# Altium schematic symbol library Regulator_Switching.SchLib: 1070 symbols (part 3 of 9)
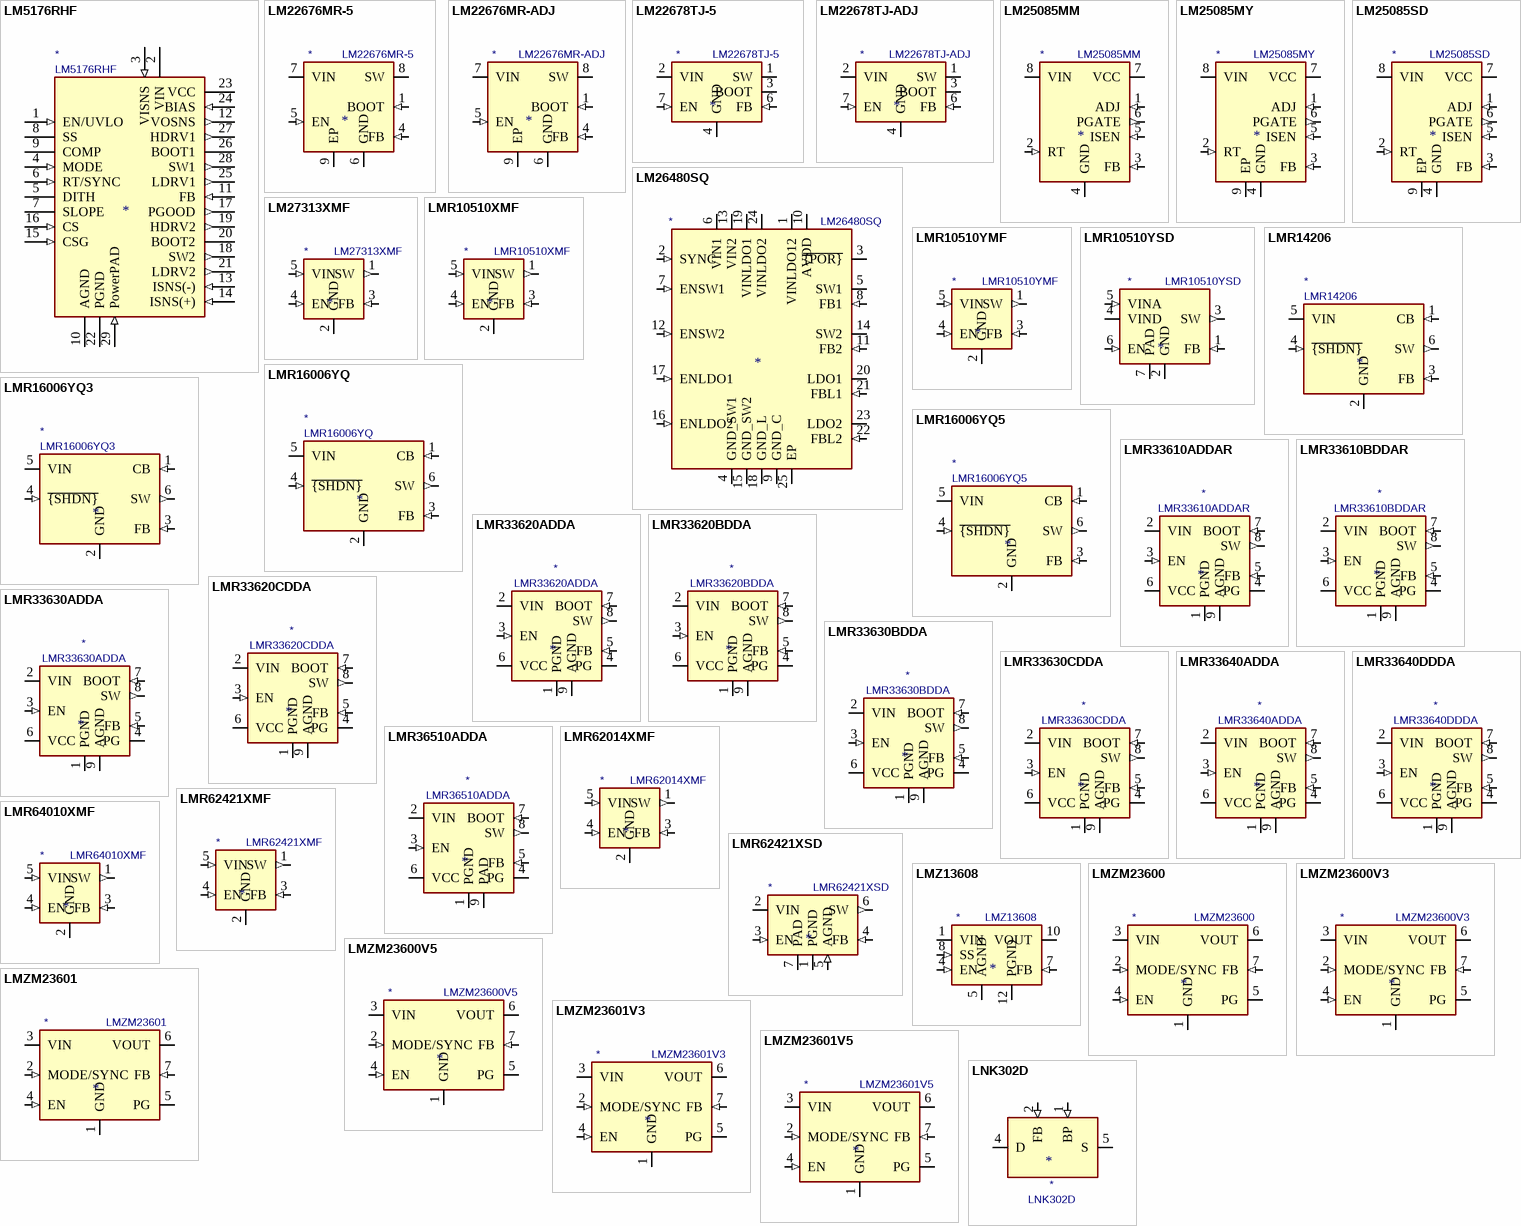
[diagram p28: symbols LM5176RHF to LNK302D]

## LM22676MR-ADJ
designator *  value LM22676MR-ADJ
ki_keywords: DC/DC Buck Converter 3A; ki_description: 3A Step-Down Switching Voltage Regulater, 4.5-42V Input, Adjustable Output, 500kHz Switching Frequency, SOIC-8; ki_fp_filters: TI*SO*PowerPAD*; Footprint: Package_SO:TI_SO-PowerPAD-8; Supplier: http://www.ti.com/lit/ds/symlink/lm22676.pdf
footprint TI_SO-PowerPAD-8
pins: 1 BOOT (in), 2 NC (in) hidden, 3 NC (in) hidden, 4 FB (in), 5 EN (in), 6 GND (power), 7 VIN (power), 8 SW (power), 9 EP (power)

## LM22678TJ-5
designator *  value LM22678TJ-5
ki_keywords: DC/DC Buck Converter 5A; ki_description: 5A Step-Down Switching Voltage Regulater, 4.5-42V Input, 5V Output, 500kHz Switching Frequency, TO-263; ki_fp_filters: TO?263*; Footprint: Package_TO_SOT_SMD:TO-263-7_TabPin8; Supplier: https://www.ti.com/lit/ds/symlink/lm22678.pdf
footprint TO-263-7_TabPin8
pins: 1 SW (power), 2 VIN (power), 3 BOOT, 4 GND (power), 5 NC (in) hidden, 6 FB (in), 7 EN (in), 8 GND hidden

## LM22678TJ-ADJ
designator *  value LM22678TJ-ADJ
ki_keywords: DC/DC Buck Converter 5A; ki_description: 5A Step-Down Switching Voltage Regulater, 4.5-42V Input, Adjustable Output, 500kHz Switching Frequency, TO-263; ki_fp_filters: TO?263*; Footprint: Package_TO_SOT_SMD:TO-263-7_TabPin8; Supplier: https://www.ti.com/lit/ds/symlink/lm22678.pdf
footprint TO-263-7_TabPin8
pins: 1 SW (power), 2 VIN (power), 3 BOOT, 4 GND (power), 5 NC (in) hidden, 6 FB (in), 7 EN (in), 8 GND hidden

## LM25085MM
designator *  value LM25085MM
ki_keywords: buck switching controller; ki_description: 42V Constant On-Time PFET Buck Switching Controller, MSOP-8; ki_fp_filters: MSOP*3x3mm*P0.65mm*; Footprint: Package_SO:MSOP-8_3x3mm_P0.65mm; Supplier: http://www.ti.com/lit/ds/symlink/lm25085.pdf
footprint MSOP-8_3x3mm_P0.65mm
pins: 1 ADJ (in), 2 RT (in), 3 FB (in), 4 GND (power), 5 ISEN (in), 6 PGATE (out), 7 VCC (power), 8 VIN (power)

## LM25085MY
designator *  value LM25085MY
ki_keywords: buck switching controller; ki_description: 42V Constant On-Time PFET Buck Switching Controller, MSOP-8-EP; ki_fp_filters: MSOP*1EP*3x3mm*P0.65mm*; Footprint: Package_SO:MSOP-8-1EP_3x3mm_P0.65mm_EP1.73x1.85mm_ThermalVias; Supplier: http://www.ti.com/lit/ds/symlink/lm25085.pdf
footprint MSOP-8-1EP_3x3mm_P0.65mm_EP1.73x1.85mm_ThermalVias
pins: 1 ADJ (in), 2 RT (in), 3 FB (in), 4 GND (power), 5 ISEN (in), 6 PGATE (out), 7 VCC (power), 8 VIN (power), 9 EP

## LM25085SD
designator *  value LM25085SD
ki_keywords: buck switching controller; ki_description: 42V Constant On-Time PFET Buck Switching Controller, WSON-8; ki_fp_filters: WSON*1EP*3x3mm*P0.5mm*EP1.6x2.0mm*; Footprint: Package_SON:WSON-8-1EP_3x3mm_P0.5mm_EP1.6x2.0mm; Supplier: http://www.ti.com/lit/ds/symlink/lm25085.pdf
footprint WSON-8-1EP_3x3mm_P0.5mm_EP1.6x2.0mm
pins: 1 ADJ (in), 2 RT (in), 3 FB (in), 4 GND (power), 5 ISEN (in), 6 PGATE (out), 7 VCC (power), 8 VIN (power), 9 EP

## LM26480SQ
designator *  value LM26480SQ
ki_keywords: Dual Buck Regulator LDO 2MHz 1.5A 300mA; ki_description: Dual 1.5A 2MHz Buck Regulators and Dual 300mA LDOs, WQFN-24; ki_fp_filters: WQFN*1EP*4x4mm*P0.5mm*; Footprint: Package_DFN_QFN:WQFN-24-1EP_4x4mm_P0.5mm_EP2.6x2.6mm; Supplier: http://www.ti.com/lit/ds/symlink/lm26480.pdf
footprint WQFN-24-1EP_4x4mm_P0.5mm_EP2.6x2.6mm
pins: 1 VINLDO12 (power), 2 SYNC (in), 3 ~{{POR}} (oc), 4 GND_SW1 (power), 5 SW1 (power), 6 VIN1 (power), 7 ENSW1 (in), 8 FB1 (in), 9 GND_C (power), 10 AVDD (power), 11 FB2 (in), 12 ENSW2 (in), 13 VIN2 (power), 14 SW2 (power), 15 GND_SW2 (power), 16 ENLDO2 (in), 17 ENLDO1 (in), 18 GND_L (power), 19 VINLDO1 (power), 20 LDO1 (power), 21 FBL1 (in), 22 FBL2 (in), 23 LDO2 (power), 24 VINLDO2 (power), 25 EP

## LM27313XMF
designator *  value LM27313XMF
ki_keywords: Miniature Step-Up Boost Voltage Regulator; ki_description: 1A, 28Vout Boost Voltage Regulator, 1.6MHz Frequency, SOT-23-5; ki_fp_filters: SOT?23*; Footprint: Package_TO_SOT_SMD:SOT-23-5; Supplier: http://www.ti.com/lit/ds/symlink/lm27313.pdf
footprint SOT-23-5
pins: 1 SW (out), 2 GND (power), 3 FB (in), 4 EN (in), 5 VIN (in)

## LMR10510XMF
designator *  value LMR10510XMF
ki_keywords: Miniature Step-Down Buck Voltage Regulator; ki_description: 1A, 5.5V Step-Down Voltage Regulator, 1.6MHz Frequency, SOT-23-5; ki_fp_filters: SOT?23*; Footprint: Package_TO_SOT_SMD:SOT-23-5; Supplier: http://www.ti.com/lit/ds/symlink/lmr10510.pdf
footprint SOT-23-5
pins: 1 SW (out), 2 GND (power), 3 FB (in), 4 EN (in), 5 VIN (in)

## LMR10510YMF
designator *  value LMR10510YMF
ki_keywords: Miniature Step-Down Buck Voltage Regulator; ki_description: 1A, 5.5V Step-Down Voltage Regulator, 3MHz Frequency, SOT-23-5; ki_fp_filters: SOT?23*; Footprint: Package_TO_SOT_SMD:SOT-23-5; Supplier: http://www.ti.com/lit/ds/symlink/lmr10510.pdf
footprint SOT-23-5
pins: 1 SW (out), 2 GND (power), 3 FB (in), 4 EN (in), 5 VIN (in)

## LMR10510YSD
designator *  value LMR10510YSD
ki_keywords: Miniature Step-Down Buck Voltage Regulator; ki_description: 1A, 5.5V Step-Down Voltage Regulator, 3MHz Frequency, WSON-6; ki_fp_filters: WSON*EP*3x3mm*P0.95mm*; Footprint: Package_SON:WSON-6-1EP_3x3mm_P0.95mm; Supplier: http://www.ti.com/lit/ds/symlink/lmr10510.pdf
footprint WSON-6-1EP_3x3mm_P0.95mm
pins: 1 FB (in), 2 GND (power), 3 SW (out), 4 VIND (power), 5 VINA (in), 6 EN (in), 7 PAD

## LMR14206
designator *  value LMR14206
ki_keywords: simple-switcher buck step-down voltage-regulator; ki_description: Simple Switcher Buck Regulator, Vin=4.5-42V, Iout=600mA, Adjustable output voltage, SOT-23-6 package; ki_fp_filters: SOT?23*; Footprint: Package_TO_SOT_SMD:SOT-23-6; Supplier: http://www.ti.com/lit/ds/symlink/lmr14206.pdf
footprint SOT-23-6
pins: 1 CB (in), 2 GND (power), 3 FB (in), 4 ~{{SHDN}} (in), 5 VIN (power), 6 SW (out)

## LMR16006YQ
designator *  value LMR16006YQ
ki_keywords: simple-switcher buck step-down voltage-regulator; ki_description: Simple Switcher Buck Regulator, Vin=4-40V, Iout=600mA, Adjustable output voltage, SOT-23-6 package; ki_fp_filters: SOT?23*; Footprint: Package_TO_SOT_SMD:SOT-23-6; Supplier: http://www.ti.com/lit/ds/symlink/lmr16006y-q1.pdf
footprint SOT-23-6
pins: 1 CB (in), 2 GND (power), 3 FB (in), 4 ~{{SHDN}} (in), 5 VIN (power), 6 SW (out)

## LMR16006YQ3
designator *  value LMR16006YQ3
ki_keywords: simple-switcher buck step-down voltage-regulator; ki_description: Simple Switcher Buck Regulator, Vin=4-40V, Iout=600mA, Fixed 3.3V output voltage, SOT-23-6 package; ki_fp_filters: SOT?23*; Footprint: Package_TO_SOT_SMD:SOT-23-6; Supplier: http://www.ti.com/lit/ds/symlink/lmr16006y-q1.pdf
footprint SOT-23-6
pins: 1 CB (in), 2 GND (power), 3 FB (in), 4 ~{{SHDN}} (in), 5 VIN (power), 6 SW (out)

## LMR16006YQ5
designator *  value LMR16006YQ5
ki_keywords: simple-switcher buck step-down voltage-regulator; ki_description: Simple Switcher Buck Regulator, Vin=4-40V, Iout=600mA, Fixed 5.0V output voltage, SOT-23-6 package; ki_fp_filters: SOT?23*; Footprint: Package_TO_SOT_SMD:SOT-23-6; Supplier: http://www.ti.com/lit/ds/symlink/lmr16006y-q1.pdf
footprint SOT-23-6
pins: 1 CB (in), 2 GND (power), 3 FB (in), 4 ~{{SHDN}} (in), 5 VIN (power), 6 SW (out)

## LMR33610ADDAR
designator *  value LMR33610ADDAR
ki_keywords: simple-switcher synchronous buck step-down voltage-regulator; ki_description: Simple Switcher Synchronous Buck Regulator, Vin=3.8-36V, Iout=1A, F=400kHz, Adjustable output voltage, HSOP-8; ki_fp_filters: Texas*HSOP*1EP*; Footprint: Package_SO:Texas_HSOP-8-1EP_3.9x4.9mm_P1.27mm_ThermalVias; Supplier: http://www.ti.com/lit/ds/symlink/lmr33610.pdf
footprint Texas_HSOP-8-1EP_3.9x4.9mm_P1.27mm_ThermalVias
pins: 1 PGND (power), 2 VIN (power), 3 EN (in), 4 PG (oc), 5 FB (in), 6 VCC (power), 7 BOOT (in), 8 SW (out), 9 AGND (power)

## LMR33610BDDAR
designator *  value LMR33610BDDAR
ki_keywords: simple-switcher synchronous buck step-down voltage-regulator; ki_description: Simple Switcher Synchronous Buck Regulator, Vin=3.8-36V, Iout=1A, F=1400kHz, Adjustable output voltage, HSOP-8; ki_fp_filters: Texas*HSOP*1EP*; Footprint: Package_SO:Texas_HSOP-8-1EP_3.9x4.9mm_P1.27mm_ThermalVias; Supplier: http://www.ti.com/lit/ds/symlink/lmr33610.pdf
footprint Texas_HSOP-8-1EP_3.9x4.9mm_P1.27mm_ThermalVias
pins: 1 PGND (power), 2 VIN (power), 3 EN (in), 4 PG (oc), 5 FB (in), 6 VCC (power), 7 BOOT (in), 8 SW (out), 9 AGND (power)

## LMR33620ADDA
designator *  value LMR33620ADDA
ki_keywords: simple-switcher synchronous buck step-down voltage-regulator; ki_description: Simple Switcher Synchronous Buck Regulator, Vin=3.8-36V, Iout=2A, F=400kHz, Adjustable output voltage, HSOP-8; ki_fp_filters: Texas*HSOP*1EP*; Footprint: Package_SO:Texas_HSOP-8-1EP_3.9x4.9mm_P1.27mm_ThermalVias; Supplier: http://www.ti.com/lit/ds/symlink/lmr33620.pdf
footprint Texas_HSOP-8-1EP_3.9x4.9mm_P1.27mm_ThermalVias
pins: 1 PGND (power), 2 VIN (power), 3 EN (in), 4 PG (oc), 5 FB (in), 6 VCC (power), 7 BOOT (in), 8 SW (out), 9 AGND (power)

## LMR33620BDDA
designator *  value LMR33620BDDA
ki_keywords: simple-switcher synchronous buck step-down voltage-regulator; ki_description: Simple Switcher Synchronous Buck Regulator, Vin=3.8-36V, Iout=2A, F=1400kHz, Adjustable output voltage, HSOP-8; ki_fp_filters: Texas*HSOP*1EP*; Footprint: Package_SO:Texas_HSOP-8-1EP_3.9x4.9mm_P1.27mm_ThermalVias; Supplier: http://www.ti.com/lit/ds/symlink/lmr33620.pdf
footprint Texas_HSOP-8-1EP_3.9x4.9mm_P1.27mm_ThermalVias
pins: 1 PGND (power), 2 VIN (power), 3 EN (in), 4 PG (oc), 5 FB (in), 6 VCC (power), 7 BOOT (in), 8 SW (out), 9 AGND (power)

## LMR33620CDDA
designator *  value LMR33620CDDA
ki_keywords: simple-switcher synchronous buck step-down voltage-regulator; ki_description: Simple Switcher Synchronous Buck Regulator, Vin=3.8-36V, Iout=2A, F=2100kHz, Adjustable output voltage, HSOP-8; ki_fp_filters: Texas*HSOP*1EP*; Footprint: Package_SO:Texas_HSOP-8-1EP_3.9x4.9mm_P1.27mm_ThermalVias; Supplier: http://www.ti.com/lit/ds/symlink/lmr33640.pdf
footprint Texas_HSOP-8-1EP_3.9x4.9mm_P1.27mm_ThermalVias
pins: 1 PGND (power), 2 VIN (power), 3 EN (in), 4 PG (oc), 5 FB (in), 6 VCC (power), 7 BOOT (in), 8 SW (out), 9 AGND (power)

## LMR33630ADDA
designator *  value LMR33630ADDA
ki_keywords: simple-switcher synchronous buck step-down voltage-regulator; ki_description: Simple Switcher Synchronous Buck Regulator, Vin=3.8-36V, Iout=3A, F=400kHz, Adjustable output voltage, HSOP-8; ki_fp_filters: Texas*HSOP*1EP*; Footprint: Package_SO:Texas_HSOP-8-1EP_3.9x4.9mm_P1.27mm_ThermalVias; Supplier: http://www.ti.com/lit/ds/symlink/lmr33630.pdf
footprint Texas_HSOP-8-1EP_3.9x4.9mm_P1.27mm_ThermalVias
pins: 1 PGND (power), 2 VIN (power), 3 EN (in), 4 PG (oc), 5 FB (in), 6 VCC (power), 7 BOOT (in), 8 SW (out), 9 AGND (power)

## LMR33630BDDA
designator *  value LMR33630BDDA
ki_keywords: simple-switcher synchronous buck step-down voltage-regulator; ki_description: Simple Switcher Synchronous Buck Regulator, Vin=3.8-36V, Iout=3A, F=1400kHz, Adjustable output voltage, HSOP-8; ki_fp_filters: Texas*HSOP*1EP*; Footprint: Package_SO:Texas_HSOP-8-1EP_3.9x4.9mm_P1.27mm_ThermalVias; Supplier: http://www.ti.com/lit/ds/symlink/lmr33630.pdf
footprint Texas_HSOP-8-1EP_3.9x4.9mm_P1.27mm_ThermalVias
pins: 1 PGND (power), 2 VIN (power), 3 EN (in), 4 PG (oc), 5 FB (in), 6 VCC (power), 7 BOOT (in), 8 SW (out), 9 AGND (power)

## LMR33630CDDA
designator *  value LMR33630CDDA
ki_keywords: simple-switcher synchronous buck step-down voltage-regulator; ki_description: Simple Switcher Synchronous Buck Regulator, Vin=3.8-36V, Iout=3A, F=2100kHz, Adjustable output voltage, HSOP-8; ki_fp_filters: Texas*HSOP*1EP*; Footprint: Package_SO:Texas_HSOP-8-1EP_3.9x4.9mm_P1.27mm_ThermalVias; Supplier: http://www.ti.com/lit/ds/symlink/lmr33630.pdf
footprint Texas_HSOP-8-1EP_3.9x4.9mm_P1.27mm_ThermalVias
pins: 1 PGND (power), 2 VIN (power), 3 EN (in), 4 PG (oc), 5 FB (in), 6 VCC (power), 7 BOOT (in), 8 SW (out), 9 AGND (power)

## LMR33640ADDA
designator *  value LMR33640ADDA
ki_keywords: simple-switcher synchronous buck step-down voltage-regulator; ki_description: Simple Switcher Synchronous Buck Regulator, Vin=3.8-36V, Iout=4A, F=400kHz, Adjustable output voltage, HSOP-8; ki_fp_filters: Texas*HSOP*1EP*; Footprint: Package_SO:Texas_HSOP-8-1EP_3.9x4.9mm_P1.27mm_ThermalVias; Supplier: http://www.ti.com/lit/ds/symlink/lmr33640.pdf
footprint Texas_HSOP-8-1EP_3.9x4.9mm_P1.27mm_ThermalVias
pins: 1 PGND (power), 2 VIN (power), 3 EN (in), 4 PG (oc), 5 FB (in), 6 VCC (power), 7 BOOT (in), 8 SW (out), 9 AGND (power)

## LMR33640DDDA
designator *  value LMR33640DDDA
ki_keywords: simple-switcher synchronous buck step-down voltage-regulator; ki_description: Simple Switcher Synchronous Buck Regulator, Vin=3.8-36V, Iout=4A, F=1000kHz, Adjustable output voltage, HSOP-8; ki_fp_filters: Texas*HSOP*1EP*; Footprint: Package_SO:Texas_HSOP-8-1EP_3.9x4.9mm_P1.27mm_ThermalVias; Supplier: http://www.ti.com/lit/ds/symlink/lmr33640.pdf
footprint Texas_HSOP-8-1EP_3.9x4.9mm_P1.27mm_ThermalVias
pins: 1 PGND (power), 2 VIN (power), 3 EN (in), 4 PG (oc), 5 FB (in), 6 VCC (power), 7 BOOT (in), 8 SW (out), 9 AGND (power)

## LMR36510ADDA
designator *  value LMR36510ADDA
ki_keywords: synchronous buck step-down; ki_description: Simple Switcher Synchronous Buck Regulator, Vin=4.2-65V, Iout=1A, F=400kHz, Adjustable output voltage, HSOP-8; ki_fp_filters: Texas*HTSOP*1EP*3.9x4.9mm*P1.27mm*EP2.95x4.9mm*Mask2.4x3.1mm*; Footprint: Package_SO:Texas_HTSOP-8-1EP_3.9x4.9mm_P1.27mm_EP2.95x4.9mm_Mask2.4x3.1mm_ThermalVias; Supplier: http://www.ti.com/lit/ds/symlink/lmr36510.pdf
footprint Texas_HTSOP-8-1EP_3.9x4.9mm_P1.27mm_EP2.95x4.9mm_Mask2.4x3.1mm_ThermalVias
pins: 1 PGND (power), 2 VIN (power), 3 EN (in), 4 PG (oc), 5 FB (in), 6 VCC (power), 7 BOOT (in), 8 SW (out), 9 PAD (power)

## LMR62014XMF
designator *  value LMR62014XMF
ki_keywords: Miniature Step-Up Boost Voltage Regulator; ki_description: 1.4A, 20Vout Step-Up Voltage Regulator, 1.6MHz Frequency, SOT-23-5; ki_fp_filters: SOT?23*; Footprint: Package_TO_SOT_SMD:SOT-23-5; Supplier: http://www.ti.com/lit/ds/symlink/lmr62014.pdf
footprint SOT-23-5
pins: 1 SW (out), 2 GND (power), 3 FB (in), 4 EN (in), 5 VIN (in)

## LMR62421XMF
designator *  value LMR62421XMF
ki_keywords: Miniature Step-Up Boost SEPIC Voltage Regulator; ki_description: 2.1A, 24Vout Boost/SEPIC Voltage Regulator, 1.6MHz Frequency, SOT-23-5; ki_fp_filters: SOT?23*; Footprint: Package_TO_SOT_SMD:SOT-23-5; Supplier: http://www.ti.com/lit/ds/symlink/lmr62421.pdf
footprint SOT-23-5
pins: 1 SW (out), 2 GND (power), 3 FB (in), 4 EN (in), 5 VIN (in)

## LMR62421XSD
designator *  value LMR62421XSD
ki_keywords: Miniature Step-Up Boost SEPIC Voltage Regulator; ki_description: 2.1A, 24Vout Step-Up Voltage Regulator, 1.6MHz Frequency, WSON-6; ki_fp_filters: WSON*EP*3x3mm*P0.95mm*; Footprint: Package_SON:WSON-6-1EP_3x3mm_P0.95mm; Supplier: http://www.ti.com/lit/ds/symlink/lmr62421.pdf
footprint WSON-6-1EP_3x3mm_P0.95mm
pins: 1 PGND (power), 2 VIN (power), 3 EN (in), 4 FB (in), 5 AGND (in), 6 SW (out), 7 PAD

## LMR64010XMF
designator *  value LMR64010XMF
ki_keywords: Miniature Step-Up Boost Voltage Regulator; ki_description: 1A, 40Vout Step-Up Voltage Regulator, 1.6MHz Frequency, SOT-23-5; ki_fp_filters: SOT?23*; Footprint: Package_TO_SOT_SMD:SOT-23-5; Supplier: http://www.ti.com/lit/ds/symlink/lmr64010.pdf
footprint SOT-23-5
pins: 1 SW (out), 2 GND (power), 3 FB (in), 4 EN (in), 5 VIN (in)

## LMZ13608
designator *  value LMZ13608
ki_keywords: Step-Down DC/DC Module; ki_description: 8A Adjustable Step-Down DC/DC Power Module in 15x15mm, Texas NDY0011A; ki_fp_filters: Texas*NDY0011A*; Footprint: Package_TO_SOT_SMD:Texas_NDY0011A; Supplier: http://www.ti.com/lit/ds/snvs710i/snvs710i.pdf
footprint Texas_NDY0011A
pins: 1 VIN (power), 2 VIN hidden, 3 AGND hidden, 4 EN (in), 5 AGND (power), 6 AGND hidden, 7 FB (in), 8 SS (in), 9 NC (in) hidden, 10 VOUT (power), 11 VOUT hidden, 12 PGND (power)

## LMZM23600
designator *  value LMZM23600
ki_keywords: Step-Down DC/DC Module; ki_description: 0.5A Adjustable Step-Down DC/DC Power Module in 3.8x3mm, MicroSIP-10; ki_fp_filters: Texas*SIL*1EP*3.8x3mm*P0.6mm*; Footprint: Package_LGA:Texas_SIL0010A_MicroSiP-10-1EP_3.8x3mm_P0.6mm_EP0.7x2.9mm_ThermalVias; Supplier: http://www.ti.com/lit/ds/symlink/lmzm23600.pdf
footprint Texas_SIL0010A_MicroSiP-10-1EP_3.8x3mm_P0.6mm_EP0.7x2.9mm_ThermalVias
pins: 1 GND (power), 2 MODE/SYNC (in), 3 VIN (power), 4 EN (in), 5 PG (oc), 6 VOUT (power), 7 FB (in), 8 (in) hidden, 9 (in) hidden, 10 (in) hidden, 11 GND hidden

## LMZM23600V3
designator *  value LMZM23600V3
ki_keywords: Step-Down DC/DC Module; ki_description: 0.5A 3.3V Step-Down DC/DC Power Module in 3.8x3mm, MicroSIP-10; ki_fp_filters: Texas*SIL*1EP*3.8x3mm*P0.6mm*; Footprint: Package_LGA:Texas_SIL0010A_MicroSiP-10-1EP_3.8x3mm_P0.6mm_EP0.7x2.9mm_ThermalVias; Supplier: http://www.ti.com/lit/ds/symlink/lmzm23600.pdf
footprint Texas_SIL0010A_MicroSiP-10-1EP_3.8x3mm_P0.6mm_EP0.7x2.9mm_ThermalVias
pins: 1 GND (power), 2 MODE/SYNC (in), 3 VIN (power), 4 EN (in), 5 PG (oc), 6 VOUT (power), 7 FB (in), 8 (in) hidden, 9 (in) hidden, 10 (in) hidden, 11 GND hidden

## LMZM23600V5
designator *  value LMZM23600V5
ki_keywords: Step-Down DC/DC Module; ki_description: 0.5A 5V Step-Down DC/DC Power Module in 3.8x3mm, MicroSIP-10; ki_fp_filters: Texas*SIL*1EP*3.8x3mm*P0.6mm*; Footprint: Package_LGA:Texas_SIL0010A_MicroSiP-10-1EP_3.8x3mm_P0.6mm_EP0.7x2.9mm_ThermalVias; Supplier: http://www.ti.com/lit/ds/symlink/lmzm23600.pdf
footprint Texas_SIL0010A_MicroSiP-10-1EP_3.8x3mm_P0.6mm_EP0.7x2.9mm_ThermalVias
pins: 1 GND (power), 2 MODE/SYNC (in), 3 VIN (power), 4 EN (in), 5 PG (oc), 6 VOUT (power), 7 FB (in), 8 (in) hidden, 9 (in) hidden, 10 (in) hidden, 11 GND hidden

## LMZM23601
designator *  value LMZM23601
ki_keywords: Step-Down DC/DC Module; ki_description: 1A Adjustable Step-Down DC/DC Power Module in 3.8x3mm, MicroSIP-10; ki_fp_filters: Texas*SIL*1EP*3.8x3mm*P0.6mm*; Footprint: Package_LGA:Texas_SIL0010A_MicroSiP-10-1EP_3.8x3mm_P0.6mm_EP0.7x2.9mm_ThermalVias; Supplier: http://www.ti.com/lit/ds/symlink/lmzm23601.pdf
footprint Texas_SIL0010A_MicroSiP-10-1EP_3.8x3mm_P0.6mm_EP0.7x2.9mm_ThermalVias
pins: 1 GND (power), 2 MODE/SYNC (in), 3 VIN (power), 4 EN (in), 5 PG (oc), 6 VOUT (power), 7 FB (in), 8 (in) hidden, 9 (in) hidden, 10 (in) hidden, 11 GND hidden

## LMZM23601V3
designator *  value LMZM23601V3
ki_keywords: Step-Down DC/DC Module; ki_description: 1A 3.3V Step-Down DC/DC Power Module in 3.8x3mm, MicroSIP-10; ki_fp_filters: Texas*SIL*1EP*3.8x3mm*P0.6mm*; Footprint: Package_LGA:Texas_SIL0010A_MicroSiP-10-1EP_3.8x3mm_P0.6mm_EP0.7x2.9mm_ThermalVias; Supplier: http://www.ti.com/lit/ds/symlink/lmzm23601.pdf
footprint Texas_SIL0010A_MicroSiP-10-1EP_3.8x3mm_P0.6mm_EP0.7x2.9mm_ThermalVias
pins: 1 GND (power), 2 MODE/SYNC (in), 3 VIN (power), 4 EN (in), 5 PG (oc), 6 VOUT (power), 7 FB (in), 8 (in) hidden, 9 (in) hidden, 10 (in) hidden, 11 GND hidden

## LMZM23601V5
designator *  value LMZM23601V5
ki_keywords: Step-Down DC/DC Module; ki_description: 1A 5V Step-Down DC/DC Power Module in 3.8x3mm, MicroSIP-10; ki_fp_filters: Texas*SIL*1EP*3.8x3mm*P0.6mm*; Footprint: Package_LGA:Texas_SIL0010A_MicroSiP-10-1EP_3.8x3mm_P0.6mm_EP0.7x2.9mm_ThermalVias; Supplier: http://www.ti.com/lit/ds/symlink/lmzm23601.pdf
footprint Texas_SIL0010A_MicroSiP-10-1EP_3.8x3mm_P0.6mm_EP0.7x2.9mm_ThermalVias
pins: 1 GND (power), 2 MODE/SYNC (in), 3 VIN (power), 4 EN (in), 5 PG (oc), 6 VOUT (power), 7 FB (in), 8 (in) hidden, 9 (in) hidden, 10 (in) hidden, 11 GND hidden

## LNK302D
designator *  value LNK302D
ki_keywords: Lowest Component Count, Energy-Efficient Off-Line Switcher IC; ki_description: LinkSwitch-TN Family, 80mA Output Current, SO-8C; ki_fp_filters: PowerIntegrations?SO?8B*; Footprint: Package_SO:PowerIntegrations_SO-8B; Supplier: http://www.powerint.com/sites/default/files/product-docs/lnk302_304-306.pdf
footprint PowerIntegrations_SO-8B
pins: 1 BP (in), 2 FB (in), 4 D (oc), 5 S (power), 6 S hidden, 7 S hidden, 8 S hidden

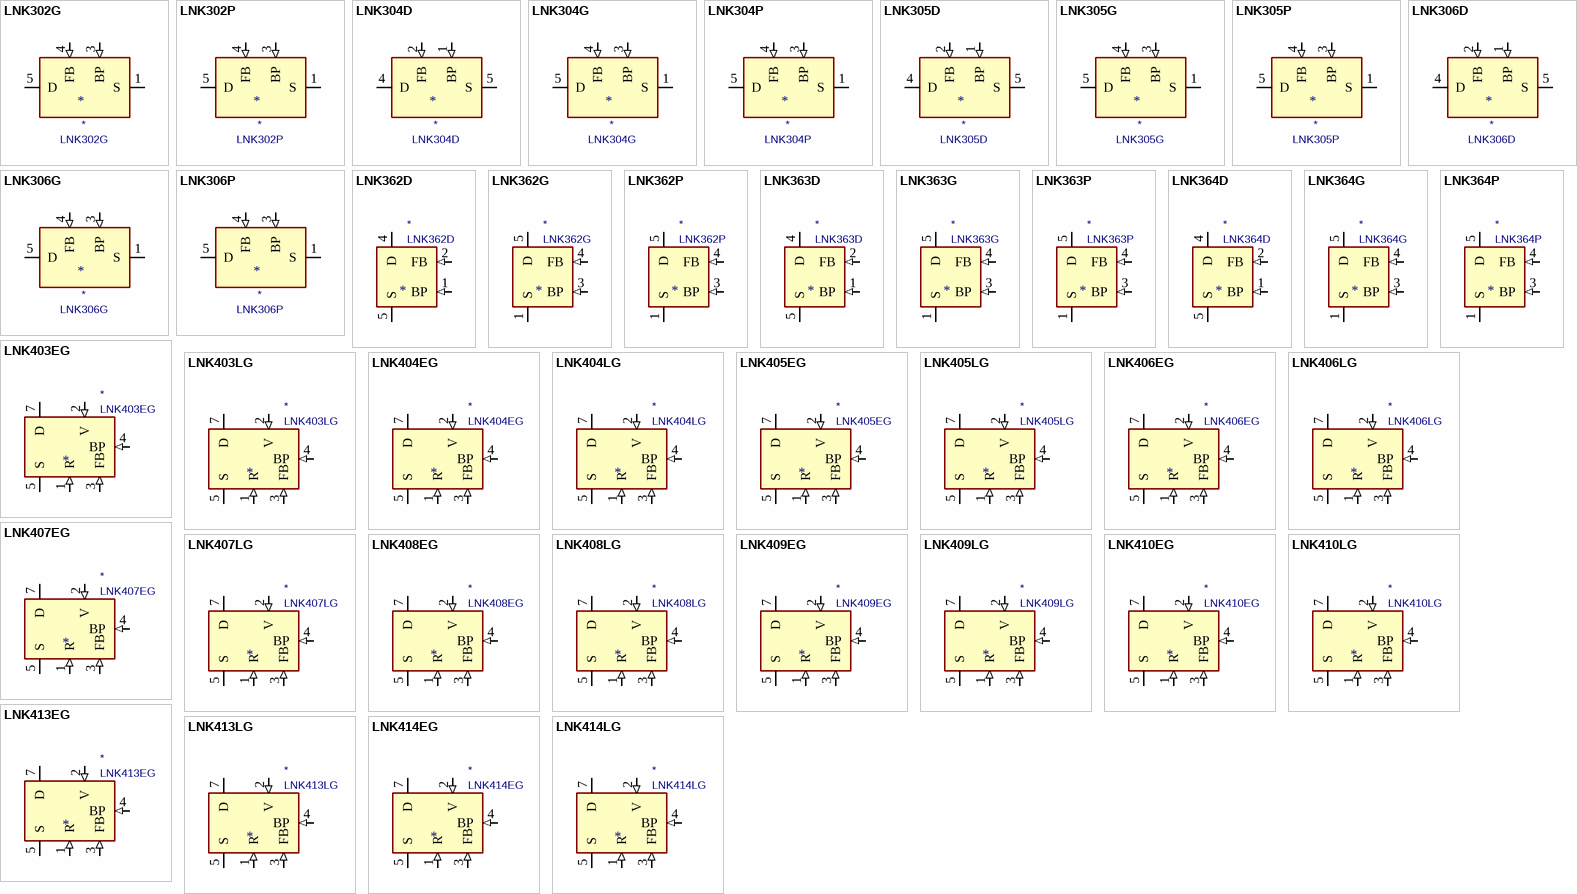
[diagram p8: symbols LNK302G to LNK414LG]

## LNK302G
designator *  value LNK302G
ki_keywords: Lowest Component Count, Energy-Efficient Off-Line Switcher IC; ki_description: LinkSwitch-TN Family, 80mA Output Current, SMD-8B; ki_fp_filters: PowerIntegrations?SMD?8B*; Footprint: Package_DIP:PowerIntegrations_SMD-8B; Supplier: http://www.powerint.com/sites/default/files/product-docs/lnk302_304-306.pdf
footprint PowerIntegrations_SMD-8B
pins: 1 S (power), 2 S hidden, 3 BP (in), 4 FB (in), 5 D (oc), 7 S hidden, 8 S hidden

## LNK302P
designator *  value LNK302P
ki_keywords: Lowest Component Count, Energy-Efficient Off-Line Switcher IC; ki_description: LinkSwitch-TN Family, 80mA Output Current, DIP-8B; ki_fp_filters: PowerIntegrations?PDIP?8B*; Footprint: Package_DIP:PowerIntegrations_PDIP-8B; Supplier: http://www.powerint.com/sites/default/files/product-docs/lnk302_304-306.pdf
footprint PowerIntegrations_PDIP-8B
pins: 1 S (power), 2 S hidden, 3 BP (in), 4 FB (in), 5 D (oc), 7 S hidden, 8 S hidden

## LNK304D
designator *  value LNK304D
ki_keywords: Lowest Component Count, Energy-Efficient Off-Line Switcher IC; ki_description: LinkSwitch-TN Family, 170mA Output Current, SO-8C; ki_fp_filters: PowerIntegrations?SO?8B*; Footprint: Package_SO:PowerIntegrations_SO-8B; Supplier: http://www.powerint.com/sites/default/files/product-docs/lnk302_304-306.pdf
footprint PowerIntegrations_SO-8B
pins: 1 BP (in), 2 FB (in), 4 D (oc), 5 S (power), 6 S hidden, 7 S hidden, 8 S hidden

## LNK304G
designator *  value LNK304G
ki_keywords: Lowest Component Count, Energy-Efficient Off-Line Switcher IC; ki_description: LinkSwitch-TN Family, 170mA Output Current, SMD-8B; ki_fp_filters: PowerIntegrations?SMD?8B*; Footprint: Package_DIP:PowerIntegrations_SMD-8B; Supplier: http://www.powerint.com/sites/default/files/product-docs/lnk302_304-306.pdf
footprint PowerIntegrations_SMD-8B
pins: 1 S (power), 2 S hidden, 3 BP (in), 4 FB (in), 5 D (oc), 7 S hidden, 8 S hidden

## LNK304P
designator *  value LNK304P
ki_keywords: Lowest Component Count, Energy-Efficient Off-Line Switcher IC; ki_description: LinkSwitch-TN Family, 170mA Output Current, DIP-8B; ki_fp_filters: PowerIntegrations?PDIP?8B*; Footprint: Package_DIP:PowerIntegrations_PDIP-8B; Supplier: http://www.powerint.com/sites/default/files/product-docs/lnk302_304-306.pdf
footprint PowerIntegrations_PDIP-8B
pins: 1 S (power), 2 S hidden, 3 BP (in), 4 FB (in), 5 D (oc), 7 S hidden, 8 S hidden

## LNK305D
designator *  value LNK305D
ki_keywords: Lowest Component Count, Energy-Efficient Off-Line Switcher IC; ki_description: LinkSwitch-TN Family, 280mA Output Current, SO-8C; ki_fp_filters: PowerIntegrations?SO?8B*; Footprint: Package_SO:PowerIntegrations_SO-8B; Supplier: http://www.powerint.com/sites/default/files/product-docs/lnk302_304-306.pdf
footprint PowerIntegrations_SO-8B
pins: 1 BP (in), 2 FB (in), 4 D (oc), 5 S (power), 6 S hidden, 7 S hidden, 8 S hidden

## LNK305G
designator *  value LNK305G
ki_keywords: Lowest Component Count, Energy-Efficient Off-Line Switcher IC; ki_description: LinkSwitch-TN Family, 280mA Output Current, SMD-8B; ki_fp_filters: PowerIntegrations?SMD?8B*; Footprint: Package_DIP:PowerIntegrations_SMD-8B; Supplier: http://www.powerint.com/sites/default/files/product-docs/lnk302_304-306.pdf
footprint PowerIntegrations_SMD-8B
pins: 1 S (power), 2 S hidden, 3 BP (in), 4 FB (in), 5 D (oc), 7 S hidden, 8 S hidden

## LNK305P
designator *  value LNK305P
ki_keywords: Lowest Component Count, Energy-Efficient Off-Line Switcher IC; ki_description: LinkSwitch-TN Family, 280mA Output Current, DIP-8B; ki_fp_filters: PowerIntegrations?PDIP?8B*; Footprint: Package_DIP:PowerIntegrations_PDIP-8B; Supplier: http://www.powerint.com/sites/default/files/product-docs/lnk302_304-306.pdf
footprint PowerIntegrations_PDIP-8B
pins: 1 S (power), 2 S hidden, 3 BP (in), 4 FB (in), 5 D (oc), 7 S hidden, 8 S hidden

## LNK306D
designator *  value LNK306D
ki_keywords: Lowest Component Count, Energy-Efficient Off-Line Switcher IC; ki_description: LinkSwitch-TN Family, 360mA Output Current, SO-8C; ki_fp_filters: PowerIntegrations?SO?8B*; Footprint: Package_SO:PowerIntegrations_SO-8B; Supplier: http://www.powerint.com/sites/default/files/product-docs/lnk302_304-306.pdf
footprint PowerIntegrations_SO-8B
pins: 1 BP (in), 2 FB (in), 4 D (oc), 5 S (power), 6 S hidden, 7 S hidden, 8 S hidden

## LNK306G
designator *  value LNK306G
ki_keywords: Lowest Component Count, Energy-Efficient Off-Line Switcher IC; ki_description: LinkSwitch-TN Family, 360mA Output Current, SMD-8B; ki_fp_filters: PowerIntegrations?SMD?8B*; Footprint: Package_DIP:PowerIntegrations_SMD-8B; Supplier: http://www.powerint.com/sites/default/files/product-docs/lnk302_304-306.pdf
footprint PowerIntegrations_SMD-8B
pins: 1 S (power), 2 S hidden, 3 BP (in), 4 FB (in), 5 D (oc), 7 S hidden, 8 S hidden

## LNK306P
designator *  value LNK306P
ki_keywords: Lowest Component Count, Energy-Efficient Off-Line Switcher IC; ki_description: LinkSwitch-TN Family, 360mA Output Current, DIP-8B; ki_fp_filters: PowerIntegrations?PDIP?8B*; Footprint: Package_DIP:PowerIntegrations_PDIP-8B; Supplier: http://www.powerint.com/sites/default/files/product-docs/lnk302_304-306.pdf
footprint PowerIntegrations_PDIP-8B
pins: 1 S (power), 2 S hidden, 3 BP (in), 4 FB (in), 5 D (oc), 7 S hidden, 8 S hidden

## LNK362D
designator *  value LNK362D
ki_keywords: Energy Effi cient, Low Power Off-Line Switcher IC; ki_description: LinkSwitch-XT Family, 2.6W Output Power, SO-8C; ki_fp_filters: PowerIntegrations?SO?8C*; Footprint: Package_SO:PowerIntegrations_SO-8C; Supplier: http://www.powerint.com/sites/default/files/product-docs/lnk362-364.pdf
footprint PowerIntegrations_SO-8C
pins: 1 BP (in), 2 FB (in), 4 D (oc), 5 S (power), 6 S hidden, 7 S hidden, 8 S hidden

## LNK362G
designator *  value LNK362G
ki_keywords: Energy Effi cient, Low Power Off-Line Switcher IC; ki_description: LinkSwitch-XT Family, 2.6W Output Power, SMD-8B; ki_fp_filters: PowerIntegrations?SMD?8B*; Footprint: Package_DIP:PowerIntegrations_SMD-8B; Supplier: http://www.powerint.com/sites/default/files/product-docs/lnk362-364.pdf
footprint PowerIntegrations_SMD-8B
pins: 1 S (power), 2 S hidden, 3 BP (in), 4 FB (in), 5 D (oc), 7 S hidden, 8 S hidden

## LNK362P
designator *  value LNK362P
ki_keywords: Energy Effi cient, Low Power Off-Line Switcher IC; ki_description: LinkSwitch-XT Family, 2.6W Output Power, DIP-8B; ki_fp_filters: PowerIntegrations?PDIP?8B*; Footprint: Package_DIP:PowerIntegrations_PDIP-8B; Supplier: http://www.powerint.com/sites/default/files/product-docs/lnk362-364.pdf
footprint PowerIntegrations_PDIP-8B
pins: 1 S (power), 2 S hidden, 3 BP (in), 4 FB (in), 5 D (oc), 7 S hidden, 8 S hidden

## LNK363D
designator *  value LNK363D
ki_keywords: Energy Effi cient, Low Power Off-Line Switcher IC; ki_description: LinkSwitch-XT Family, 4.7W Output Power, SO-8C; ki_fp_filters: PowerIntegrations?SO?8C*; Footprint: Package_SO:PowerIntegrations_SO-8C; Supplier: http://www.powerint.com/sites/default/files/product-docs/lnk362-364.pdf
footprint PowerIntegrations_SO-8C
pins: 1 BP (in), 2 FB (in), 4 D (oc), 5 S (power), 6 S hidden, 7 S hidden, 8 S hidden

## LNK363G
designator *  value LNK363G
ki_keywords: Energy Effi cient, Low Power Off-Line Switcher IC; ki_description: LinkSwitch-XT Family, 4.7W Output Power, SMD-8B; ki_fp_filters: PowerIntegrations?SMD?8B*; Footprint: Package_DIP:PowerIntegrations_SMD-8B; Supplier: http://www.powerint.com/sites/default/files/product-docs/lnk362-364.pdf
footprint PowerIntegrations_SMD-8B
pins: 1 S (power), 2 S hidden, 3 BP (in), 4 FB (in), 5 D (oc), 7 S hidden, 8 S hidden

## LNK363P
designator *  value LNK363P
ki_keywords: Energy Effi cient, Low Power Off-Line Switcher IC; ki_description: LinkSwitch-XT Family, 4.7W Output Power, DIP-8B; ki_fp_filters: PowerIntegrations?PDIP?8B*; Footprint: Package_DIP:PowerIntegrations_PDIP-8B; Supplier: http://www.powerint.com/sites/default/files/product-docs/lnk362-364.pdf
footprint PowerIntegrations_PDIP-8B
pins: 1 S (power), 2 S hidden, 3 BP (in), 4 FB (in), 5 D (oc), 7 S hidden, 8 S hidden

## LNK364D
designator *  value LNK364D
ki_keywords: Energy Effi cient, Low Power Off-Line Switcher IC; ki_description: LinkSwitch-XT Family, 6W Output Power, SO-8C; ki_fp_filters: PowerIntegrations?SO?8C*; Footprint: Package_SO:PowerIntegrations_SO-8C; Supplier: http://www.powerint.com/sites/default/files/product-docs/lnk362-364.pdf
footprint PowerIntegrations_SO-8C
pins: 1 BP (in), 2 FB (in), 4 D (oc), 5 S (power), 6 S hidden, 7 S hidden, 8 S hidden

## LNK364G
designator *  value LNK364G
ki_keywords: Energy Effi cient, Low Power Off-Line Switcher IC; ki_description: LinkSwitch-XT Family, 6W Output Power, SMD-8B; ki_fp_filters: PowerIntegrations?SMD?8B*; Footprint: Package_DIP:PowerIntegrations_SMD-8B; Supplier: http://www.powerint.com/sites/default/files/product-docs/lnk362-364.pdf
footprint PowerIntegrations_SMD-8B
pins: 1 S (power), 2 S hidden, 3 BP (in), 4 FB (in), 5 D (oc), 7 S hidden, 8 S hidden

## LNK364P
designator *  value LNK364P
ki_keywords: Energy Effi cient, Low Power Off-Line Switcher IC; ki_description: LinkSwitch-XT Family, 6W Output Power, DIP-8B; ki_fp_filters: PowerIntegrations?PDIP?8B*; Footprint: Package_DIP:PowerIntegrations_PDIP-8B; Supplier: http://www.powerint.com/sites/default/files/product-docs/lnk362-364.pdf
footprint PowerIntegrations_PDIP-8B
pins: 1 S (power), 2 S hidden, 3 BP (in), 4 FB (in), 5 D (oc), 7 S hidden, 8 S hidden

## LNK403EG
designator *  value LNK403EG
ki_keywords: LED Driver IC with TRIAC Dimming, Single-Stage PFC and Primary-Side Constant Current Control; ki_description: LinkSwitch-PH Family, 12W Output Power, eSIP-7C; ki_fp_filters: PowerIntegrations?eSIP?7C*; Footprint: Package_SIP:PowerIntegrations_eSIP-7C; Supplier: http://www.powerint.com/sites/default/files/product-docs/linkswitch-ph_family_datasheet.pdf
footprint PowerIntegrations_eSIP-7C
pins: 1 R (in), 2 V (in), 3 FB (in), 4 BP (in), 5 S (power), 7 D (oc)

## LNK403LG
designator *  value LNK403LG
ki_keywords: LED Driver IC with TRIAC Dimming, Single-Stage PFC and Primary-Side Constant Current Control; ki_description: LinkSwitch-PH Family, 12W Output Power, eSIP-7F; ki_fp_filters: PowerIntegrations?eSIP?7F*; Footprint: Package_SIP:PowerIntegrations_eSIP-7F; Supplier: http://www.powerint.com/sites/default/files/product-docs/linkswitch-ph_family_datasheet.pdf
footprint PowerIntegrations_eSIP-7F
pins: 1 R (in), 2 V (in), 3 FB (in), 4 BP (in), 5 S (power), 7 D (oc)

## LNK404EG
designator *  value LNK404EG
ki_keywords: LED Driver IC with TRIAC Dimming, Single-Stage PFC and Primary-Side Constant Current Control; ki_description: LinkSwitch-PH Family, 15W Output Power, eSIP-7C; ki_fp_filters: PowerIntegrations?eSIP?7C*; Footprint: Package_SIP:PowerIntegrations_eSIP-7C; Supplier: http://www.powerint.com/sites/default/files/product-docs/linkswitch-ph_family_datasheet.pdf
footprint PowerIntegrations_eSIP-7C
pins: 1 R (in), 2 V (in), 3 FB (in), 4 BP (in), 5 S (power), 7 D (oc)

## LNK404LG
designator *  value LNK404LG
ki_keywords: LED Driver IC with TRIAC Dimming, Single-Stage PFC and Primary-Side Constant Current Control; ki_description: LinkSwitch-PH Family, 15W Output Power, eSIP-7F; ki_fp_filters: PowerIntegrations?eSIP?7F*; Footprint: Package_SIP:PowerIntegrations_eSIP-7F; Supplier: http://www.powerint.com/sites/default/files/product-docs/linkswitch-ph_family_datasheet.pdf
footprint PowerIntegrations_eSIP-7F
pins: 1 R (in), 2 V (in), 3 FB (in), 4 BP (in), 5 S (power), 7 D (oc)

## LNK405EG
designator *  value LNK405EG
ki_keywords: LED Driver IC with TRIAC Dimming, Single-Stage PFC and Primary-Side Constant Current Control; ki_description: LinkSwitch-PH Family, 18W Output Power, eSIP-7C; ki_fp_filters: PowerIntegrations?eSIP?7C*; Footprint: Package_SIP:PowerIntegrations_eSIP-7C; Supplier: http://www.powerint.com/sites/default/files/product-docs/linkswitch-ph_family_datasheet.pdf
footprint PowerIntegrations_eSIP-7C
pins: 1 R (in), 2 V (in), 3 FB (in), 4 BP (in), 5 S (power), 7 D (oc)

## LNK405LG
designator *  value LNK405LG
ki_keywords: LED Driver IC with TRIAC Dimming, Single-Stage PFC and Primary-Side Constant Current Control; ki_description: LinkSwitch-PH Family, 18W Output Power, eSIP-7F; ki_fp_filters: PowerIntegrations?eSIP?7F*; Footprint: Package_SIP:PowerIntegrations_eSIP-7F; Supplier: http://www.powerint.com/sites/default/files/product-docs/linkswitch-ph_family_datasheet.pdf
footprint PowerIntegrations_eSIP-7F
pins: 1 R (in), 2 V (in), 3 FB (in), 4 BP (in), 5 S (power), 7 D (oc)